# Altium footprint library ZYF_Common.PcbLib: 64 footprints (part 2 of 4)
Each footprint in its own frame and in the unit in brackets; x right, y up, seen from the top. Pads: shape width x height; smd on the part's side, far side on the other; paste and mask are expansions set on the pad; w line width, h text height; cw(c..) or ccw(c..) is an arc to the next point about the centre after c.
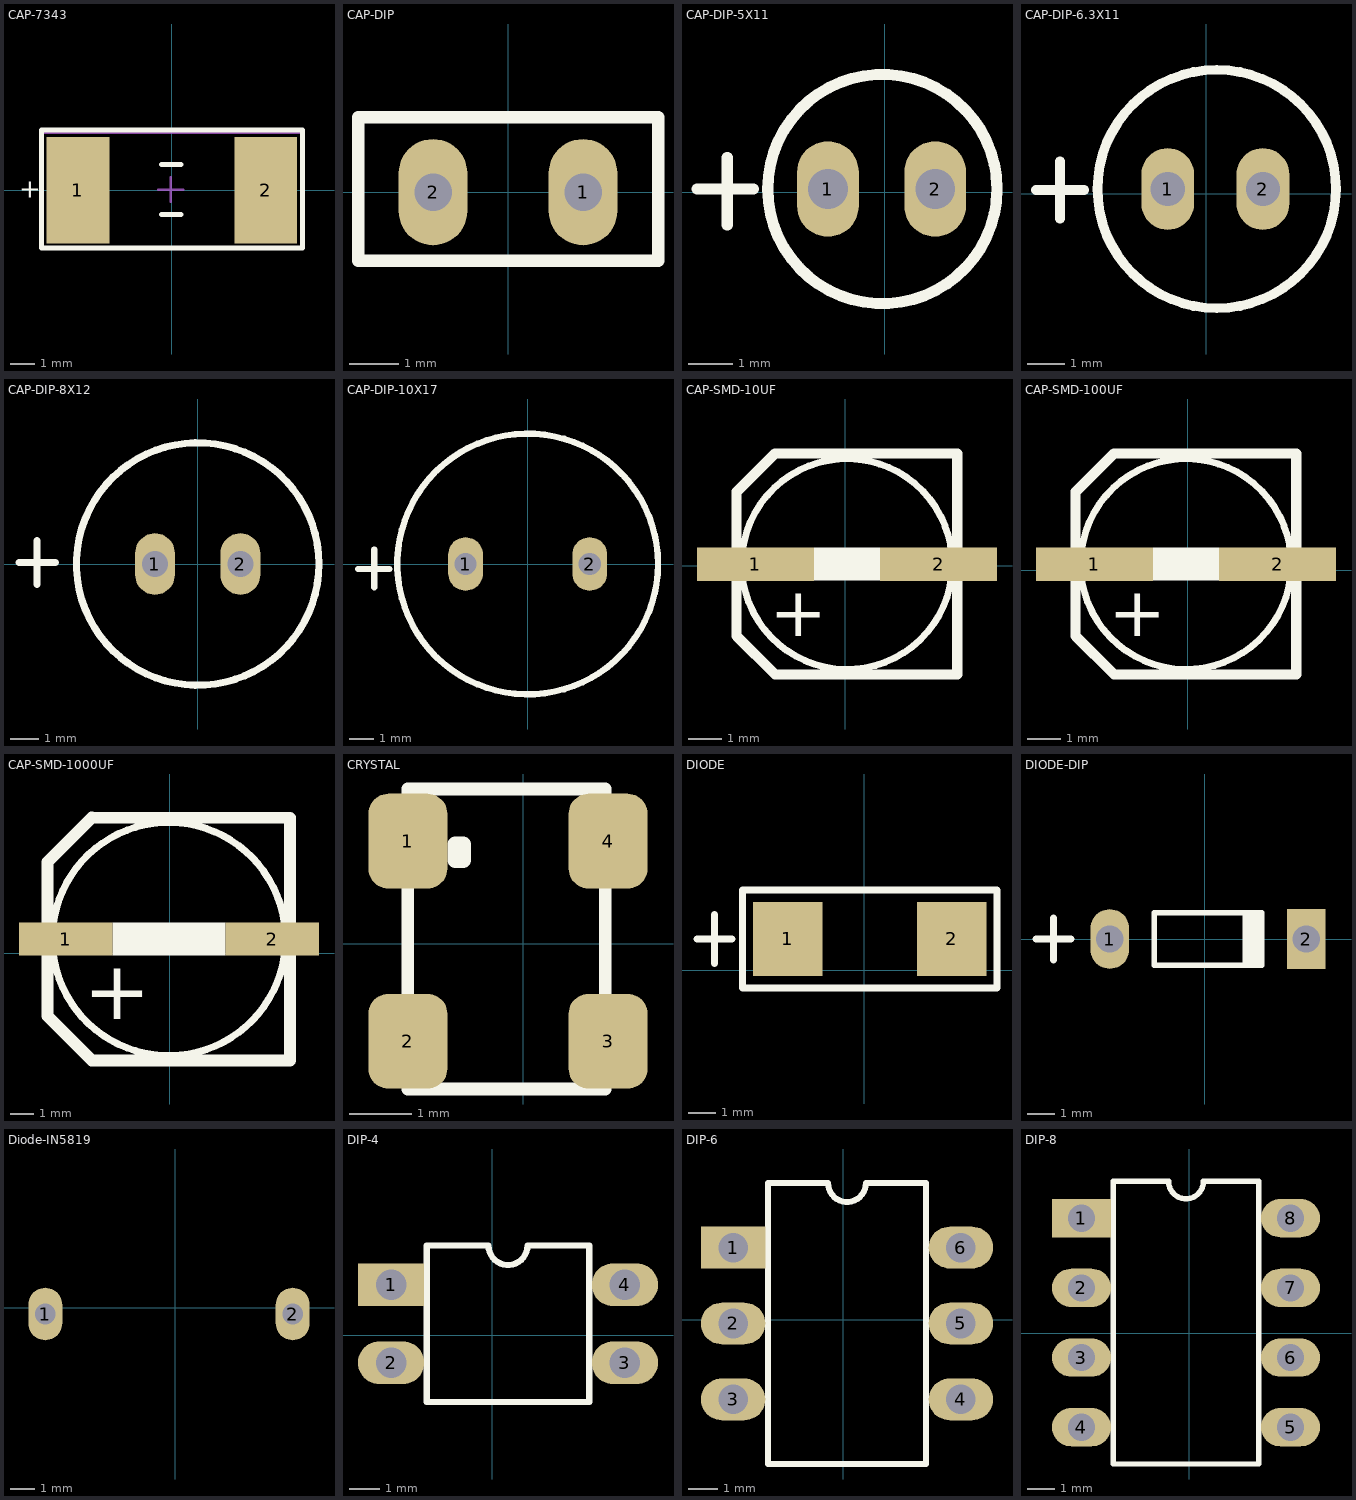
[diagram p1: the footprints below, top view; thin cyan lines are the x and y axes]

## CAP-7343 [mil]
pads (2):
  rect 100x170 smd: 1(-150,0) 2(149.61,0.01)
Top Overlay:
  lines w7.87: -17,-39 14.5,-39 ; -17,41 14.5,41 ; -208,-92 208,-92 208,11 208,96 -208,96 -208,-92
  text "+" at -244,-12 h30
Mechanical 13:
  lines w3.94: -208,-92 -208,92 208,92 208,-92 -208,-92
Mechanical 15:
  lines w3.94: -21.68,1 17.68,1 ; -2,-18.68 -2,20.69 ; -208,-92 -208,92 208,92 208,-92 -208,-92
3D body: height 157.48, standoff 0, extent -149.6,-90.54 149.61,90.56

## CAP-DIP [mil]
pads (2):
  oval 55x85 hole 30: 1(60,0) 2(-60,0)
Top Overlay:
  lines w10: -120,-55 120,-55 120,60 -120,60 -120,-55

## CAP-DIP-5X11 [mil]
pads (2):
  oval 55x85 hole 35.43: 1(-50.5,3) 2(45,3)
Top Overlay:
  circle w10: c-2,3 r102.02
  lines w10: -167,3 -117,3 ; -140,-29 -140,31
3D body: height 531.5, standoff -118.11, extent -110.27,-107.93 105.34,107.93

## CAP-DIP-6.3X11 [mil]
pads (2):
  oval 55x85 hole 35.43: 1(-40,5) 2(59,5)
Top Overlay:
  circle w10: c11,5 r124.02
  lines w10: -177,4 -127,4 ; -152,-26 -152,34
3D body: height 492.13, standoff -118.11, extent -121.86,-129.45 144.71,137.44

## CAP-DIP-8X12 [mil]
pads (2):
  oval 55x85 hole 35.43: 1(-59.06,0) 2(59.06,0)
Top Overlay:
  circle w10: c0,0 r167.61
  lines w10: -247,2 -197,2 ; -222,-28 -222,32
3D body: height 566.93, standoff -114.17, extent -161.41,-161.41 161.42,161.42

## CAP-DIP-10X17 [mil]
pads (2):
  oval 55x85 hole 35.43: 1(-98.43,0) 2(98.43,0)
Top Overlay:
  circle w10: c0,0 r206.69
  lines w10: -269,-8 -219,-8 ; -243,-37 -243,23
3D body: height 511.81, standoff -118.11, extent -163.32,-178.81 169.89,154.81

## CAP-SMD-10UF [mm]
pads (2):
  rect 3.5x1 smd: 1(-2.687,0.051) 2(2.788,0.051)
Top Overlay:
  rectangle: -0.94,-0.446 1.043,0.55
  lines w0.203: 2.981,1.205 cw(c0.049,0.052) 2.98,1.206
  lines w0.305: -2.1,-3.252 -3.251,-2.101 -3.251,2.214 -2.1,3.365 ; -2.097,-3.254 3.349,-3.254 3.349,3.36 -2.095,3.36
  text "+" at -2.256,-2.113 h1.5
3D body: height 7.7, standoff 0, extent -3.625,-3.224 3.675,3.376

## CAP-SMD-100UF [mm]
pads (2):
  rect 3.5x1 smd: 1(-2.788,0.178) 2(2.687,0.178)
Top Overlay:
  rectangle: -1.042,-0.319 0.942,0.677
  lines w0.203: 2.879,1.332 cw(c-0.052,0.179) 2.879,1.333
  lines w0.305: -2.201,-3.125 -3.352,-1.974 -3.352,2.341 -2.201,3.492 ; -2.199,-3.127 3.248,-3.127 3.248,3.487 -2.196,3.487
  text "+" at -2.358,-1.986 h1.5
3D body: height 7.7, standoff 0, extent -3.726,-3.097 3.574,3.503

## CAP-SMD-1000UF [mm]
pads (2):
  rect 4x1.4 smd: 1(-4.455,0.61) 2(4.404,0.61)
Top Overlay:
  circle w0.305: c-0.033,0.61 r5
  rectangle: -2.45,-0.092 2.394,1.317
  lines w0.508: -3.335,5.813 -5.233,3.915 -5.233,-2.694 -3.335,-4.592 5.165,-4.592 5.165,5.81 -3.332,5.81
  text "+" at -3.675,-2.83 h2.5
3D body: height 10.3, standoff -0.2, extent -5.926,-4.64 5.874,5.86

## CRYSTAL [mil]
pads (4):
  rrect50% 50x60 smd: 1(-73,65) 2(-73,-61.77) 3(53.77,-61.77) 4(53.77,65)
Top Overlay:
  lines w8: -73,-92 51.98,-92 51.98,98 -73,98 -73,-92
  lines w10: -43,53 -43,63 -38,63 -38,53 -43,53
3D body: height 39.37, standoff 0, extent -73.98,-95.43 52,101.43

## DIODE [mil]
pads (2):
  rect 100x106.3 smd: 1(-110,45) 2(125,45)
Top Overlay:
  lines w10: -240,45 -190,45 ; -215,10 -215,80 ; -175,-25 -175,115 190,115 190,-25 -175,-25
3D body: height 84.69, standoff -1.97, extent -89.42,-8.15 107.43,98.15

## DIODE-DIP [mil]
pads (2):
  oval 55x85 hole 39: 1(-134.76,0)
  rect 55x85 hole 39: 2(144.76,0)
Top Overlay:
  rectangle: 54.21,-37.4 85.71,37.4
  lines w7.87: 81.77,-37.4 -71.77,-37.4 -71.77,37.4 81.77,37.4
  lines w10: -240,0 -190,0 ; -215,-30 -215,30

## Diode-IN5819 [mil]
pads (2):
  oval 55x85 hole 33.46: 1(-210,-10) 2(190,-10)
Bottom Overlay:
  lines w7.87: -170,-10 -140,-10 ; 70,-60 70,40 ; 120,-10 150,-10 ; -140,-60 -140,40 120,40 120,-60 -140,-60

## DIP-4 [mil]
pads (4):
  rect 85x55 hole 39: 1(-130,65)
  oval 85x55 hole 39: 2(-130,-35) 3(170,-35) 4(170,65)
Top Overlay:
  lines w7.87: -84.33,-85.39 -84.33,115.39 -5,115.39 ccw(c20,115.39) 45,115.39 124.33,115.39 124.33,-85.39 -84.33,-85.39
3D body: height 204.33, standoff -150, extent -139.55,-123.76 183.56,155.77

## DIP-6 [mil]
pads (6):
  rect 85x55 hole 39 paste+0 mask+4: 1(-145,95)
  oval 85x55 hole 39 paste+0 mask+4: 2(-145,-5) 3(-145,-105) 4(155,-105) 5(155,-5) 6(155,95)
Top Overlay:
  lines w7.87: -99.33,-190.04 109.33,-190.04 109.33,180.04 30,180.04 cw(c5,180.04) -20,180.04 -99.33,180.04 -99.33,-190.04
3D body: height 153.15, standoff -150, extent -199.57,-175.5 214,161.5

## DIP-8 [mil]
pads (8):
  rect 85x55 hole 39: 1(-155,165)
  oval 85x55 hole 39: 2(-155,65) 3(-155,-35) 4(-155,-135) 5(145,-135) 6(145,-35) 7(145,65) 8(145,165)
Top Overlay:
  lines w7.87: -109.33,-187.76 99.33,-187.76 99.33,217.76 20,217.76 cw(c-5,217.76) -30,217.76 -109.33,217.76 -109.33,-187.76
3D body: height 204.33, standoff -150, extent -165.56,-226.15 157.56,254.16